# Altium footprint library Connectors Pad Lib.PcbLib: 211 footprints (part 3 of 14)
Each footprint in its own frame and in the unit in brackets; x right, y up, seen from the top. Pads: shape width x height; smd on the part's side, far side on the other; paste and mask are expansions set on the pad; w line width, h text height; cw(c..) or ccw(c..) is an arc to the next point about the centre after c.
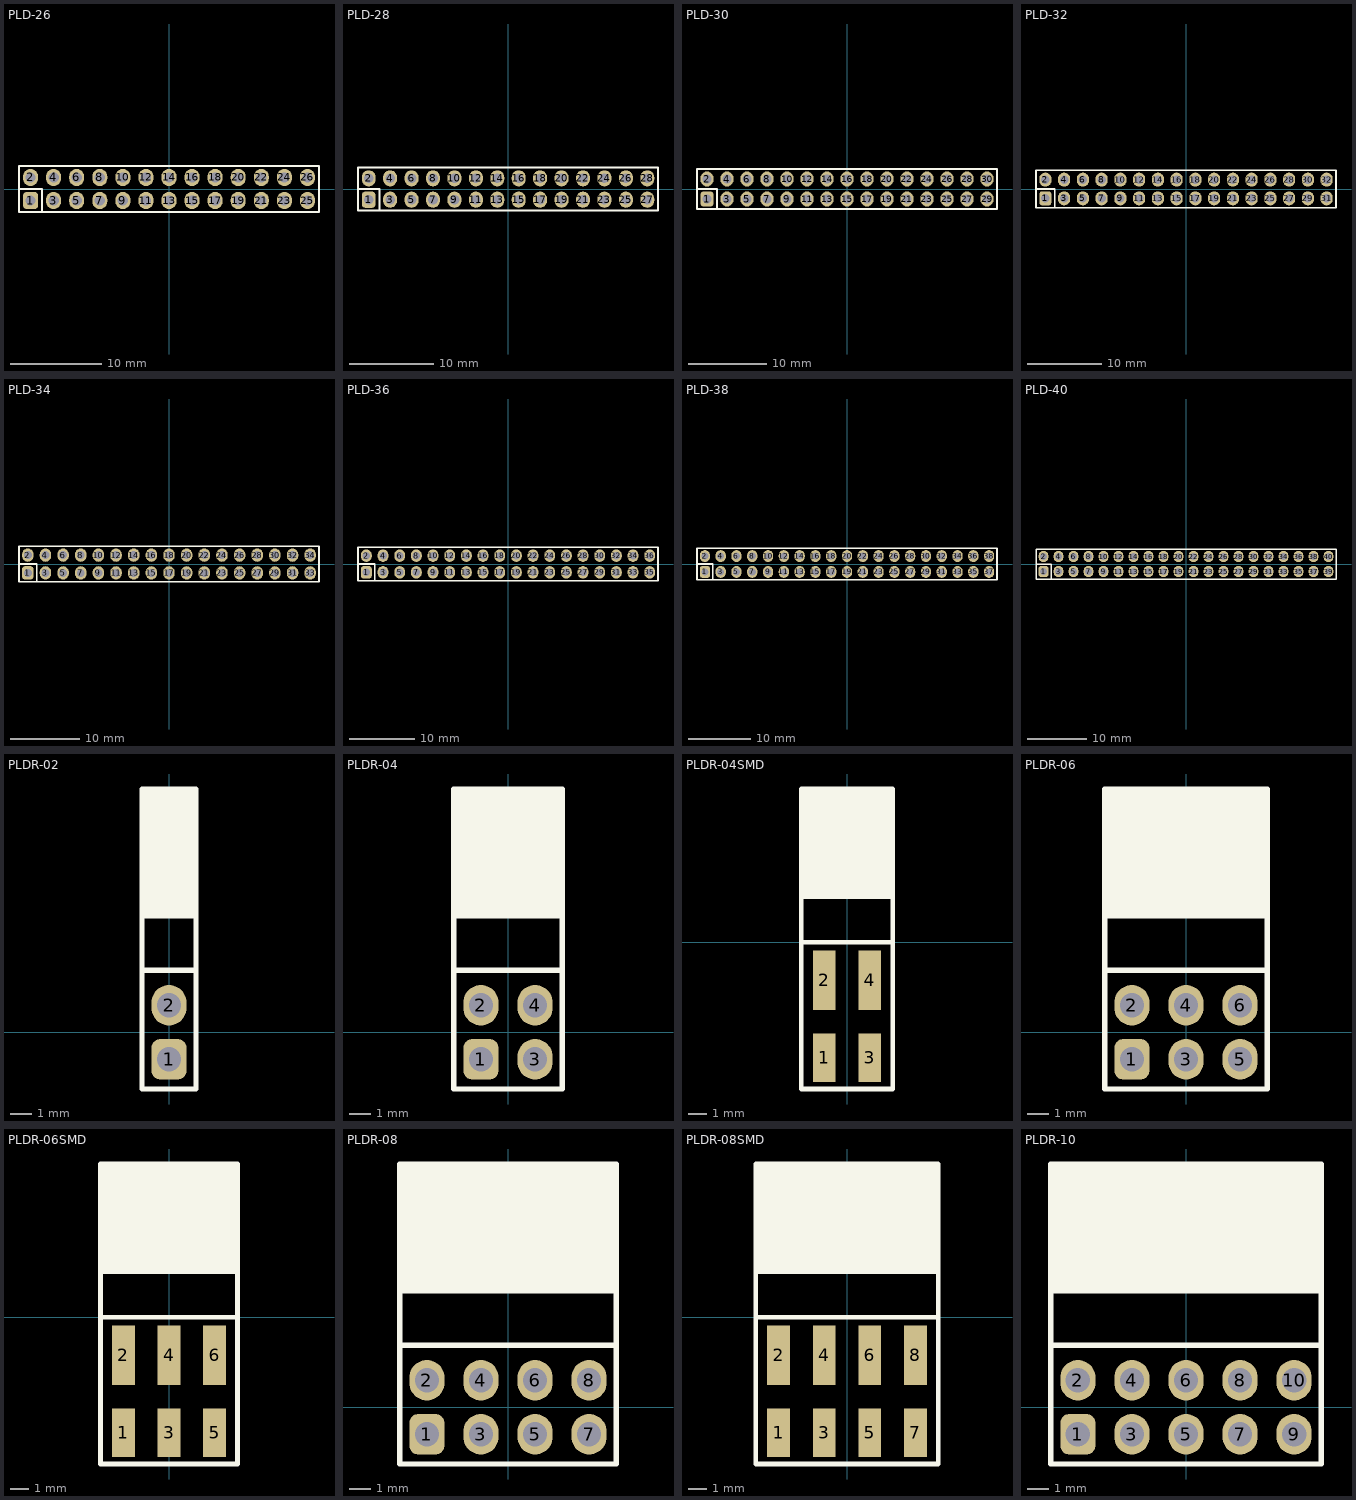
[diagram p2: the footprints below, top view; thin cyan lines are the x and y axes]

## PLD-26 [mil] "PCB Vertical Dual Connector 26-Pin"
height 336.22
pads (26):
  rrect50% 65x75 hole 45: 1(-600,-50)
  oval 65x75 hole 45: 2(-600,50) 3(-500,-50) 4(-500,50) 5(-400,-50) 6(-400,50) 7(-300,-50) 8(-300,50) 9(-200,-50) 10(-200,50) 11(-100,-50) 12(-100,50) 13(0,-50) 14(0,50) 15(100,-50) 16(100,50) 17(200,-50) 18(200,50) 19(300,-50) 20(300,50) 21(400,-50) 22(400,50) 23(500,-50) 24(500,50) 25(600,-50) 26(600,50)
Top Overlay:
  lines w10: -650,0 -550,0 -550,-100 ; -650,-100 650,-100 650,100 -650,100 -650,-100
3D body "PLD-26.STEP": height 341.16, standoff -117.11, extent -650,-98.43 650,98.43

## PLD-28 [mil] "PCB Vertical Dual Connector 28-Pin"
height 336.22
pads (28):
  rrect50% 65x75 hole 45: 1(-650,-50)
  oval 65x75 hole 45: 2(-650,50) 3(-550,-50) 4(-550,50) 5(-450,-50) 6(-450,50) 7(-350,-50) 8(-350,50) 9(-250,-50) 10(-250,50) 11(-150,-50) 12(-150,50) 13(-50,-50) 14(-50,50) 15(50,-50) 16(50,50) 17(150,-50) 18(150,50) 19(250,-50) 20(250,50) 21(350,-50) 22(350,50) 23(450,-50) 24(450,50) 25(550,-50) 26(550,50) 27(650,-50) 28(650,50)
Top Overlay:
  lines w10: -700,0 -600,0 -600,-100 ; -700,-100 700,-100 700,100 -700,100 -700,-100
3D body "PLD-28.STEP": height 341.16, standoff -117.11, extent -700,-98.43 700,98.43

## PLD-30 [mil] "PCB Vertical Dual Connector 30-Pin"
height 336.22
pads (30):
  rrect50% 65x75 hole 45: 1(-700,-50)
  oval 65x75 hole 45: 2(-700,50) 3(-600,-50) 4(-600,50) 5(-500,-50) 6(-500,50) 7(-400,-50) 8(-400,50) 9(-300,-50) 10(-300,50) 11(-200,-50) 12(-200,50) 13(-100,-50) 14(-100,50) 15(0,-50) 16(0,50) 17(100,-50) 18(100,50) 19(200,-50) 20(200,50) 21(300,-50) 22(300,50) 23(400,-50) 24(400,50) 25(500,-50) 26(500,50) 27(600,-50) 28(600,50) 29(700,-50) 30(700,50)
Top Overlay:
  lines w10: -750,0 -650,0 -650,-100 ; -750,-100 750,-100 750,100 -750,100 -750,-100
3D body "PLD-30.STEP": height 341.16, standoff -117.11, extent -750,-98.43 750,98.43

## PLD-32 [mil] "PCB Vertical Dual Connector 32-Pin"
height 336.22
pads (32):
  rrect50% 65x75 hole 45: 1(-750,-50)
  oval 65x75 hole 45: 2(-750,50) 3(-650,-50) 4(-650,50) 5(-550,-50) 6(-550,50) 7(-450,-50) 8(-450,50) 9(-350,-50) 10(-350,50) 11(-250,-50) 12(-250,50) 13(-150,-50) 14(-150,50) 15(-50,-50) 16(-50,50) 17(50,-50) 18(50,50) 19(150,-50) 20(150,50) 21(250,-50) 22(250,50) 23(350,-50) 24(350,50) 25(450,-50) 26(450,50) 27(550,-50) 28(550,50) 29(650,-50) 30(650,50) 31(750,-50) 32(750,50)
Top Overlay:
  lines w10: -800,0 -700,0 -700,-100 ; -800,-100 -800,100 800,100 800,-100 -800,-100
3D body "PLD-32.STEP": height 341.16, standoff -117.11, extent -800,-98.43 800,98.43

## PLD-34 [mil] "PCB Vertical Dual Connector 34-Pin"
height 336.22
pads (34):
  rrect50% 65x75 hole 45: 1(-800,-50)
  oval 65x75 hole 45: 2(-800,50) 3(-700,-50) 4(-700,50) 5(-600,-50) 6(-600,50) 7(-500,-50) 8(-500,50) 9(-400,-50) 10(-400,50) 11(-300,-50) 12(-300,50) 13(-200,-50) 14(-200,50) 15(-100,-50) 16(-100,50) 17(0,-50) 18(0,50) 19(100,-50) 20(100,50) 21(200,-50) 22(200,50) 23(300,-50) 24(300,50) 25(400,-50) 26(400,50) 27(500,-50) 28(500,50) 29(600,-50) 30(600,50) 31(700,-50) 32(700,50) 33(800,-50) 34(800,50)
Top Overlay:
  lines w10: -850,0 -750,0 -750,-100 ; -850,-100 -850,100 850,100 850,-100 -850,-100
3D body "PLD-34.STEP": height 341.16, standoff -117.11, extent -850,-98.43 850,98.43

## PLD-36 [mil] "PCB Vertical Dual Connector 36-Pin"
height 336.22
pads (36):
  rrect50% 65x75 hole 45: 1(-850,-50)
  oval 65x75 hole 45: 2(-850,50) 3(-750,-50) 4(-750,50) 5(-650,-50) 6(-650,50) 7(-550,-50) 8(-550,50) 9(-450,-50) 10(-450,50) 11(-350,-50) 12(-350,50) 13(-250,-50) 14(-250,50) 15(-150,-50) 16(-150,50) 17(-50,-50) 18(-50,50) 19(50,-50) 20(50,50) 21(150,-50) 22(150,50) 23(250,-50) 24(250,50) 25(350,-50) 26(350,50) 27(450,-50) 28(450,50) 29(550,-50) 30(550,50) 31(650,-50) 32(650,50) 33(750,-50) 34(750,50) 35(850,-50) 36(850,50)
Top Overlay:
  lines w10: -900,0 -800,0 -800,-100 ; -900,-100 -900,100 900,100 900,-100 -900,-100
3D body "PLD-36.STEP": height 341.16, standoff -117.11, extent -900,-98.43 900,98.43

## PLD-38 [mil] "PCB Vertical Dual Connector 38-Pin"
height 336.22
pads (38):
  rrect50% 65x75 hole 45: 1(-900,-50)
  oval 65x75 hole 45: 2(-900,50) 3(-800,-50) 4(-800,50) 5(-700,-50) 6(-700,50) 7(-600,-50) 8(-600,50) 9(-500,-50) 10(-500,50) 11(-400,-50) 12(-400,50) 13(-300,-50) 14(-300,50) 15(-200,-50) 16(-200,50) 17(-100,-50) 18(-100,50) 19(0,-50) 20(0,50) 21(100,-50) 22(100,50) 23(200,-50) 24(200,50) 25(300,-50) 26(300,50) 27(400,-50) 28(400,50) 29(500,-50) 30(500,50) 31(600,-50) 32(600,50) 33(700,-50) 34(700,50) 35(800,-50) 36(800,50) 37(900,-50) 38(900,50)
Top Overlay:
  lines w10: -950,0 -850,0 -850,-100 ; -950,-100 -950,100 950,100 950,-100 -950,-100
3D body "PLD-38.STEP": height 341.16, standoff -117.11, extent -950,-98.43 950,98.43

## PLD-40 [mil] "PCB Vertical Dual Connector 40-Pin"
height 336.22
pads (40):
  rrect50% 65x75 hole 45: 1(-950,-50)
  oval 65x75 hole 45: 2(-950,50) 3(-850,-50) 4(-850,50) 5(-750,-50) 6(-750,50) 7(-650,-50) 8(-650,50) 9(-550,-50) 10(-550,50) 11(-450,-50) 12(-450,50) 13(-350,-50) 14(-350,50) 15(-250,-50) 16(-250,50) 17(-150,-50) 18(-150,50) 19(-50,-50) 20(-50,50) 21(50,-50) 22(50,50) 23(150,-50) 24(150,50) 25(250,-50) 26(250,50) 27(350,-50) 28(350,50) 29(450,-50) 30(450,50) 31(550,-50) 32(550,50) 33(650,-50) 34(650,50) 35(750,-50) 36(750,50) 37(850,-50) 38(850,50) 39(950,-50) 40(950,50)
Top Overlay:
  lines w10: -1000,0 -900,0 -900,-100 ; -1000,-100 1000,-100 1000,100 -1000,100 -1000,-100
3D body "PLD-40.STEP": height 341.16, standoff -117.11, extent -1000,-98.43 1000,98.43

## PLDR-02 [mil] "PCB Right Angled Dual Connector 2-Pin"
height 197
pads (2):
  rrect50% 65x75 hole 45: 1(0,-50)
  oval 65x75 hole 45: 2(0,50)
Top Overlay:
  rectangle: -50,215 50,450
  lines w10: -50,115 50,115 ; -50,215 50,215 ; -50,-105 50,-105 50,450 -50,450 -50,-105
3D body "PLDR-02.STEP": height 198.43, standoff -116.54, extent -50,-62.6 50,450.79

## PLDR-04 [mil] "PCB Right Angled Dual Connector 4-Pin"
height 197
pads (4):
  rrect50% 65x75 hole 45: 1(-50,-50)
  oval 65x75 hole 45: 2(-50,50) 3(50,-50) 4(50,50)
Top Overlay:
  rectangle: -100,215 100,450
  lines w10: -100,115 100,115 ; -100,215 100,215 ; -100,-105 -100,450 100,450 100,-105 -100,-105
3D body "PLDR-04.STEP": height 198.43, standoff -116.54, extent -100,-62.6 100,450.79

## PLDR-04SMD [mm] "PCB Right Angled Dual Connector SMD 4-Pin"
height 5.004
pads (4):
  rect 1.27x2.7 smd: 1(-1.27,-6.41) 3(1.27,-6.41)
  rect 1.27x3.3 smd: 2(-1.27,-2.11) 4(1.27,-2.11)
Top Overlay:
  rectangle: -2.54,2.54 2.54,8.534
  lines w0.254: -2.54,0 2.54,0 ; -2.54,2.54 2.54,2.54 ; -2.54,-8.153 2.54,-8.153 2.54,8.534 -2.54,8.534 -2.54,-8.153
3D body "PLDR_SMD-04.STEP": height 5.04, standoff 0.04, extent -2.54,-7.3 2.54,8.54

## PLDR-06 [mil] "PCB Right Angled Dual Connector 6-Pin"
height 197
pads (6):
  rrect50% 65x75 hole 45: 1(-100,-50)
  oval 65x75 hole 45: 2(-100,50) 3(0,-50) 4(0,50) 5(100,-50) 6(100,50)
Top Overlay:
  rectangle: -150,215 150,450
  lines w10: -150,115 150,115 ; -150,215 150,215 ; -150,-105 150,-105 150,450 -150,450 -150,-105
3D body "PLDR-06.STEP": height 198.43, standoff -116.54, extent -150,-62.6 150,450.79

## PLDR-06SMD [mm] "PCB Right Angled Dual Connector SMD 6-Pin"
height 5.004
pads (6):
  rect 1.27x2.7 smd: 1(-2.54,-6.41) 3(0,-6.41) 5(2.54,-6.41)
  rect 1.27x3.3 smd: 2(-2.54,-2.11) 4(0,-2.11) 6(2.54,-2.11)
Top Overlay:
  rectangle: -3.81,2.54 3.81,8.534
  lines w0.254: -3.81,0 3.81,0 ; -3.81,2.54 3.81,2.54 ; -3.81,-8.153 3.81,-8.153 3.81,8.534 -3.81,8.534 -3.81,-8.153
3D body "PLDR_SMD-06.STEP": height 5.04, standoff 0.04, extent -3.81,-7.3 3.81,8.54

## PLDR-08 [mil] "PCB Right Angled Dual Connector 8-Pin"
height 197
pads (8):
  rrect50% 65x75 hole 45: 1(-150,-50)
  oval 65x75 hole 45: 2(-150,50) 3(-50,-50) 4(-50,50) 5(50,-50) 6(50,50) 7(150,-50) 8(150,50)
Top Overlay:
  rectangle: -200,215 200,450
  lines w10: -200,115 200,115 ; -200,215 200,215 ; -200,-105 -200,450 200,450 200,-105 -200,-105
3D body "PLDR-08.STEP": height 198.43, standoff -116.54, extent -200,-62.6 200,450.79

## PLDR-08SMD [mm] "PCB Right Angled Dual Connector SMD 8-Pin"
height 5.004
pads (8):
  rect 1.27x2.7 smd: 1(-3.81,-6.41) 3(-1.27,-6.41) 5(1.27,-6.41) 7(3.81,-6.41)
  rect 1.27x3.3 smd: 2(-3.81,-2.11) 4(-1.27,-2.11) 6(1.27,-2.11) 8(3.81,-2.11)
Top Overlay:
  rectangle: -5.08,2.54 5.08,8.534
  lines w0.254: -5.08,0 5.08,0 ; -5.08,2.54 5.08,2.54 ; -5.08,-8.153 -5.08,8.534 5.08,8.534 5.08,-8.153 -5.08,-8.153
3D body "PLDR_SMD-08.STEP": height 5.04, standoff 0.04, extent -5.08,-7.3 5.08,8.54

## PLDR-10 [mil] "PCB Right Angled Dual Connector 10-Pin"
height 197
pads (10):
  rrect50% 65x75 hole 45: 1(-200,-50)
  oval 65x75 hole 45: 2(-200,50) 3(-100,-50) 4(-100,50) 5(0,-50) 6(0,50) 7(100,-50) 8(100,50) 9(200,-50) 10(200,50)
Top Overlay:
  rectangle: -250,215 250,450
  lines w10: -250,115 250,115 ; -250,215 250,215 ; -250,-105 250,-105 250,450 -250,450 -250,-105
3D body "PLDR-10.STEP": height 198.43, standoff -116.54, extent -250,-62.6 250,450.79